# Altium footprint library PCB_LU_V2.PcbLib: 47 footprints (part 3 of 3)
Each footprint in its own frame and in the unit in brackets; x right, y up, seen from the top. Pads: shape width x height; smd on the part's side, far side on the other; paste and mask are expansions set on the pad; w line width, h text height; cw(c..) or ccw(c..) is an arc to the next point about the centre after c.
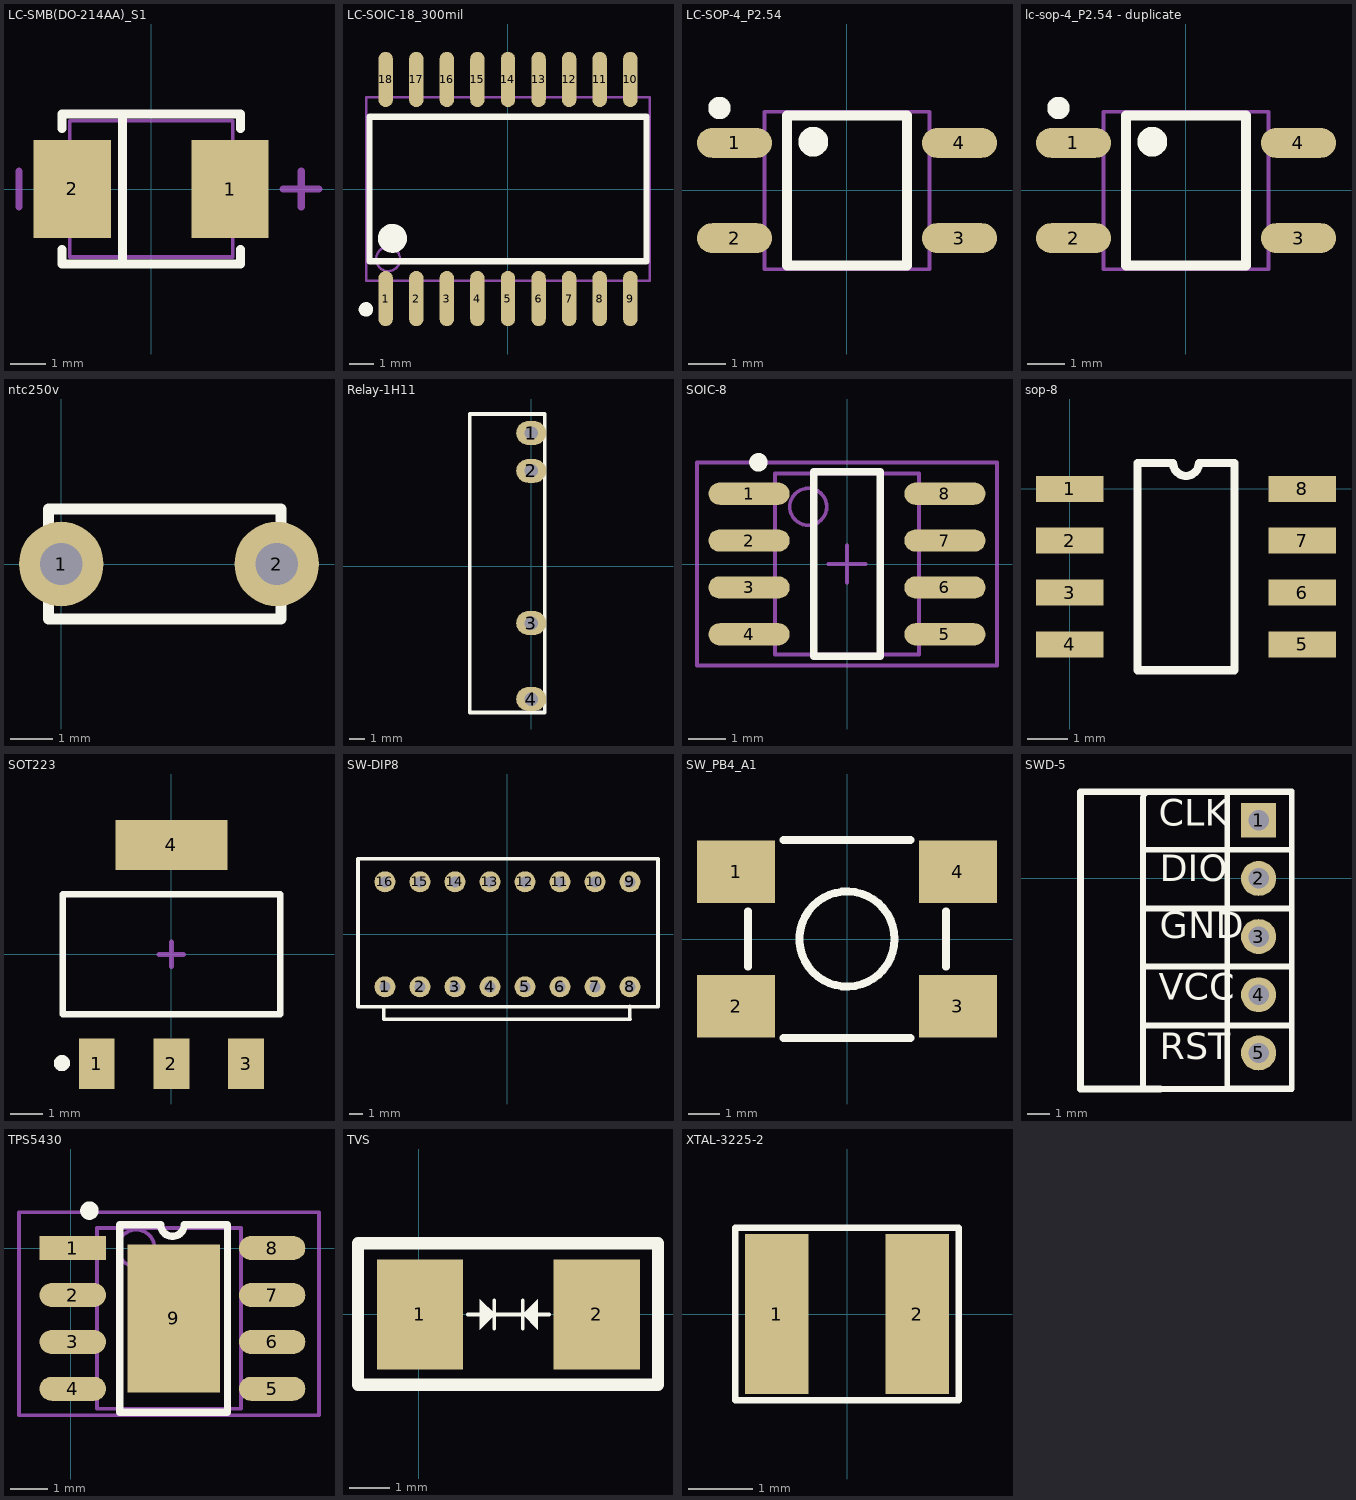
[diagram p2: the footprints below, top view; thin cyan lines are the x and y axes]

## LC-SMB(DO-214AA)_S1 [mm]
pads (2):
  rect 2.159x2.743 smd: 1(2.21,0) 2(-2.21,0)
Top Overlay:
  lines w0.254: -2.5,-1.7 -2.5,-2.1 2.5,-2.1 2.5,-1.7 ; -2.5,1.7 -2.5,2.1 2.5,2.1 2.5,1.7 ; -0.8,-2.1 -0.8,2.1
Mechanical 13:
  lines w0.1: -2.285,-1.905 -2.285,1.905 2.285,1.905 2.285,-1.905 -2.285,-1.905
Mechanical 15:
  lines w0.203: -3.7,-0.5 -3.7,0.5 ; 3.7,0 4.7,0 ; 4.2,-0.5 4.2,0.5

## LC-SOIC-18_300mil [mm]
pads (18):
  oval 0.6x2.3 smd: 1(-5.08,-4.55) 2(-3.81,-4.55) 3(-2.54,-4.55) 4(-1.27,-4.55) 5(0,-4.55) 6(1.27,-4.55) 7(2.54,-4.55) 8(3.81,-4.55) 9(5.08,-4.55) 10(5.08,4.55) 11(3.81,4.55) 12(2.54,4.55) 13(1.27,4.55) 14(0,4.55) 15(-1.27,4.55) 16(-2.54,4.55) 17(-3.81,4.55) 18(-5.08,4.55)
Top Overlay:
  circle w0.6: c-4.8,-2.05 r0.3
  circle w0.3: c-5.9,-5 r0.15
  lines w0.254: -5.75,-3 5.75,-3 5.75,3 -5.75,3 -5.75,-3
Mechanical 13:
  circle w0.1: c-4.98,-2.91 r0.5
  lines w0.1: -5.88,-3.81 5.88,-3.81 5.88,3.81 -5.88,3.81 -5.88,-3.81

## LC-SOP-4_P2.54 [mm]
height 1.5
pads (4):
  oval 2x0.8 smd: 1(-3,1.27) 2(-3,-1.27) 3(3,-1.27) 4(3,1.27)
Top Overlay:
  circle w0.4: c-0.9,1.3 r0.2
  circle w0.3: c-3.4,2.2 r0.15
  lines w0.254: -1.6,-2 1.6,-2 1.6,2 -1.6,2 -1.6,-2
Mechanical 13:
  lines w0.1: -2.2,-2.1 2.2,-2.1 2.2,2.1 -2.2,2.1 -2.2,-2.1

## lc-sop-4_P2.54 - duplicate [mm]
pads (4):
  oval 2x0.8 smd: 1(-3,1.27) 2(-3,-1.27) 3(3,-1.27) 4(3,1.27)
Top Overlay:
  circle w0.4: c-0.9,1.3 r0.2
  circle w0.3: c-3.4,2.2 r0.15
  lines w0.254: -1.6,-2 1.6,-2 1.6,2 -1.6,2 -1.6,-2
Mechanical 13:
  lines w0.1: -2.2,-2.1 2.2,-2.1 2.2,2.1 -2.2,2.1 -2.2,-2.1

## ntc250v [mm]
height 10
pads (2):
  round 2 hole 1: 1(0,0) 2(5.1,0)
Top Overlay:
  lines w0.254: -0.3,-1.3 5.2,-1.3 5.2,1.3 -0.3,1.3 -0.3,-1.3

## Relay-1H11 [mm]
pads (4):
  oval 2x1.6 hole 0.9: 1(0,8.89) 2(0,6.36) 3(0,-3.81) 4(0,-8.89)
Top Overlay:
  lines w0.254: -4.1,-9.79 0.9,-9.79 0.9,9.86 0.9,10.16 -4.1,10.16 -4.1,9.86 -4.1,-9.79

## SOIC-8 [mm]
height 1.75
pads (8):
  oval 2.2x0.6 smd: 1(-2.654,1.905) 2(-2.654,0.635) 3(-2.654,-0.635) 4(-2.654,-1.905) 5(2.654,-1.905) 6(2.654,-0.635) 7(2.654,0.635) 8(2.654,1.905)
Top Overlay:
  circle w0.25: c-2.4,2.755 r0.125
  lines w0.2: -0.9,-2.5 0.9,-2.5 0.9,2.5 -0.9,2.5 -0.9,-2.5
Mechanical 13:
  circle w0.1: c-1.05,1.55 r0.5
  lines w0.1: -1.95,-2.45 1.95,-2.45 1.95,2.45 -1.95,2.45 -1.95,-2.45
Mechanical 15:
  lines w0.1: -0.5,0 0.5,0 ; 0,-0.5 0,0.5 ; -4.064,-2.75 4.064,-2.75 4.064,2.75 -4.064,2.75 -4.064,-2.75
3D body "SO-8.STEP": height 1.7, standoff 0, extent -3,-2.45 3,2.45

## sop-8 [mil]
pads (8):
  rect 65x25 smd: 1(0,0) 2(0,-50) 3(0,-100) 4(0,-150) 5(224.41,-150) 6(224.41,-100) 7(224.41,-50) 8(224.41,0)
Top Overlay:
  lines w7.87: 65.37,-175 159.04,-175 159.04,25 124.7,25 cw(c112.2,25) 99.7,25 65.37,25 65.37,-175

## SOT223 [mm]
height 1.8
pads (4):
  rect 1.1x1.55 smd: 1(-2.3,-3.375) 2(0,-3.375) 3(2.3,-3.375)
  rect 3.45x1.55 smd: 4(0,3.375)
Top Overlay:
  circle w0.25: c-3.376,-3.353 r0.125
  lines w0.2: -3.35,-1.85 3.35,-1.85 3.35,1.85 -3.35,1.85 -3.35,-1.85
Mechanical 15:
  lines w0.15: -0.381,0 0.381,0 ; 0,-0.381 0,0.381
3D body "SOT223.STEP": height 1.7, standoff 0, extent -3.25,-3.48 3.25,3.48

## SW-DIP8 [mil]
pads (16):
  round 60 hole 31.5: 1(-350,-150) 2(-250,-150) 3(-150,-150) 4(-50,-150) 5(50,-150) 6(150,-150) 7(250,-150) 8(350,-150) 9(350,150) 10(250,150) 11(150,150) 12(50,150) 13(-50,150) 14(-150,150) 15(-250,150) 16(-350,150)
Top Overlay:
  lines w10: -353,-208 -353,-243 351,-243 350,-242 350,-205 ; -427,-206.7 -427,216 430,216 430,-206.7 -427,-206.7
3D body "User Library-DIPSWITCH8.SLDPRT": height 271.65, standoff -125.98, extent -427,-194 435.2,206

## SW_PB4_A1 [mm]
pads (4):
  rect 2.5x2 smd: 1(-3.556,2.159) 2(-3.556,-2.159) 3(3.556,-2.159) 4(3.556,2.159)
Top Overlay:
  circle w0.254: c0,0 r1.524
  lines w0.25: -3.175,-0.889 -3.175,0.889 ; -2.032,-3.175 2.032,-3.175 ; -2.032,3.175 2.032,3.175 ; 3.175,-0.889 3.175,0.889
3D body: height 6, standoff 0, extent -1.524,-1.524 1.524,1.524
3D body: height 1.5, standoff 0, extent -3.175,-3.175 3.175,3.175

## SWD-5 [mil]
pads (5):
  rect 60.63x60 hole 35: 1(-320,100)
  oval 60.63x60 hole 35: 2(-320,0) 3(-320,-100) 4(-320,-200) 5(-320,-300)
Top Overlay:
  lines w10: -519,-251.63 -518,-252.63 -264,-252.63 ; -519,-151.63 -267,-151.63 ; -519,99.37 -519,137.37 ; -518,49.37 -264,49.37 ; -515,-51.63 -264,-51.63 ; -307,149 -507.37,149 ccw(c-507.37,137.37) -519,137.37 ; -263,-362 -517.63,-362 cw(c-517.63,-360.63) -519,-360.63 -519,137.37 ; -374,-361 -263,-361 -263,150 -374,150 -374,-361
  lines w11.81: -493,149 -264,149 ; -489,-362 -626.63,-362 -626,-361.37 -626,149 -468,149
  text "DIO" at -489.87,-20 h78.74
  text "CLK" at -491.87,75 h78.74
  text "GND" at -489.87,-118 h78.74
  text "VCC" at -491.87,-224 h78.74
  text "RST" at -489.87,-326 h78.74

## TPS5430 [mm]
pads (9):
  rect 1.8x0.65 smd: 1(0.061,0)
  oval 1.8x0.65 smd: 2(0.061,-1.27) 3(0.061,-2.54) 4(0.061,-3.81) 5(5.461,-3.81) 6(5.461,-2.54) 7(5.461,-1.27) 8(5.461,0)
  rect 2.5x4 smd: 9(2.794,-1.905)
Top Overlay:
  circle w0.25: c0.51,1.016 r0.125
  lines w0.2: 1.331,-4.445 4.252,-4.445 4.252,0.635 3.079,0.635 cw(c2.761,0.635) 2.444,0.635 1.331,0.635 1.331,-4.445
Mechanical 13:
  circle w0.1: c1.778,0 r0.5
  lines w0.1: 0.717,-4.355 4.617,-4.355 4.617,0.545 0.717,0.545 0.717,-4.355
Mechanical 15:
  lines w0.1: -1.397,-4.528 -1.397,0.972 6.731,0.972 6.731,-4.528 -1.397,-4.528
3D body "SO-8.STEP": height 1.7, standoff 0, extent -0.206,-4.355 5.794,0.545

## TVS [mil]
pads (2):
  rect 85x107.99 smd: 1(0.98,0) 2(175,0)
Top Overlay:
  region: 60,15 75,0 60,-15
  region: 117,-15 102,0 117,15
  lines w3.6: 48,0 128,0 ; 74,-14 74,14 ; 102,-14 102,14
  lines w12: -60,-69.06 235.13,-69.06 235.13,70 -60,70 -60,-69.06

## XTAL-3225-2 [mm]
pads (2):
  rect 1x2.5 smd: 1(-1.1,0) 2(1.1,0)
Top Overlay:
  lines w0.1: -1.75,-1.35 -1.75,1.35 1.75,1.35 1.75,-1.35 -1.75,-1.35